# Altium footprint library Misc.PCBLIB: 128 footprints (part 4 of 8)
Each footprint in its own frame and in the unit in brackets; x right, y up, seen from the top. Pads: shape width x height; smd on the part's side, far side on the other; paste and mask are expansions set on the pad; w line width, h text height; cw(c..) or ccw(c..) is an arc to the next point about the centre after c.
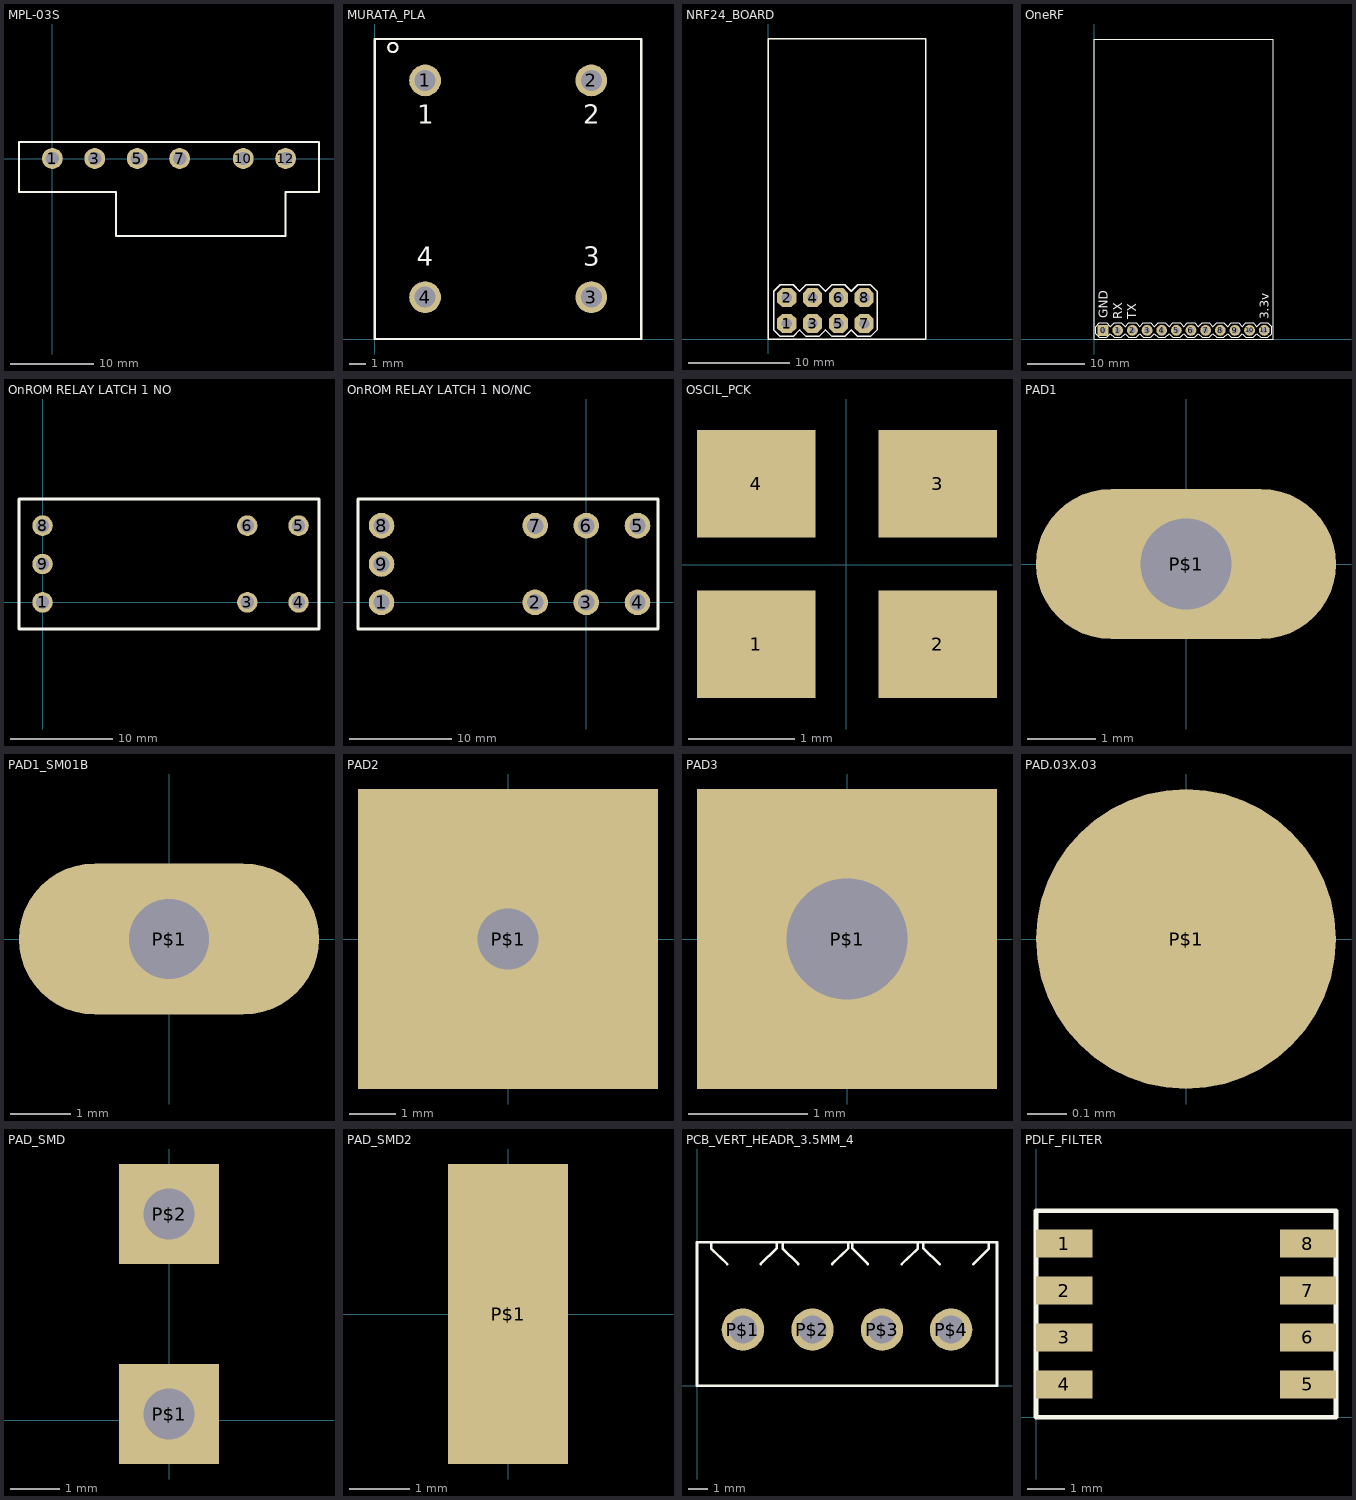
[diagram p3: the footprints below, top view; thin cyan lines are the x and y axes]

## MPL-03S [mm] "Single Output 3W Ultra-Miniature SOIP AC/DC Power Supplies"
pads (6):
  round 2.5 hole 1.6: 1(0,0) 3(5.08,0) 5(10.16,0) 7(15.24,0) 10(22.86,0) 12(27.94,0)
Top Overlay:
  lines w0.254: 31.94,1.9 31.94,-4 27.94,-4 27.94,-9.3 7.6,-9.3 7.6,-4 -4,-4 -4,2 31.94,2
3D body "MPL-03SEUP  3D.stp": height 23.72, standoff 0, extent -2.533,-7.751 30.495,1.525

## MURATA_PLA [mil]
pads (4):
  round 75 hole 50: 1(119,611) 2(512,611) 3(512,99) 4(119,99)
Top Overlay:
  circle w5: c43,689 r11
  lines w5: 0,0 630,0 630,709 0,709 0,0
  text "4" at 99,158 h77.5
  text "3" at 493,158 h77.5
  text "2" at 493,493 h77.5
  text "1" at 101,493 h77.5
3D body "User Library-PLA10-1.STEP": height 641.54, standoff -129.92, extent 19.72,19.89 610.28,680.98

## NRF24_BOARD [mil]
pads (8):
  oct 74x74 hole 40: 1(72,60) 2(72,160) 3(172,60) 4(172,160) 5(272,60) 6(272,160) 7(372,60) 8(372,160)
Top Overlay:
  lines w5: 0,0 611,0 611,1162 0,1162 0,0
  lines w6: 22,35 47,10 97,10 122,35 147,10 197,10 222,35 247,10 297,10 322,35 347,10 397,10 422,35 422,185 397,210 347,210 322,185 297,210 247,210 222,185 197,210 147,210 122,185 97,210 47,210 22,185 22,35
Mechanical 16:
  rectangle: 62,50 82,70
  rectangle: 62,150 82,170
  rectangle: 162,150 182,170
  rectangle: 162,50 182,70
  rectangle: 262,150 282,170
  rectangle: 262,50 282,70
  rectangle: 362,150 382,170
  rectangle: 362,50 382,70

## OneRF [mil]
pads (12):
  rect 74x74 hole 40: 0(59.06,59.06)
  round 74 hole 40: 1(159.06,59.06) 2(259.06,59.06) 3(359.06,59.06) 4(459.06,59.06) 5(559.06,59.06) 6(659.06,59.06) 7(759.06,59.06) 8(859.06,59.06) 9(959.06,59.06) 10(1059.06,59.06) 11(1159.06,59.06)
Top Overlay:
  lines w5: 0,0 0,2047.24 1220.47,2047.24 1220.47,0 0,0
  lines w8: 9.25,35.24 9.25,85.24 34.25,110.24 84.25,110.24 109.25,85.24 134.25,110.24 184.25,110.24 209.25,85.24 234.25,110.24 284.25,110.24 309.25,85.24 334.25,110.24 384.25,110.24 409.25,85.24 434.25,110.24 484.25,110.24 509.25,85.24 534.25,110.24 584.25,110.24 609.25,85.24 634.25,110.24 684.25,110.24 709.25,85.24 734.25,110.24 784.25,110.24 809.25,85.24 834.25,110.24 884.25,110.24 909.25,85.24 934.25,110.24 984.25,110.24 1009.25,85.24 1034.25,110.24 1084.25,110.24 1109.25,85.24 1134.25,110.24 1184.25,110.24 1209.25,85.24 1209.25,35.24 1184.25,10.24 1134.25,10.24 1109.25,35.24 1084.25,10.24 1034.25,10.24 1009.25,35.24 984.25,10.24 934.25,10.24 909.25,35.24 884.25,10.24 834.25,10.24 809.25,35.24 784.25,10.24 734.25,10.24 709.25,35.24 684.25,10.24 634.25,10.24 609.25,35.24 584.25,10.24 534.25,10.24 509.25,35.24 484.25,10.24 434.25,10.24 409.25,35.24 384.25,10.24 334.25,10.24 309.25,35.24 284.25,10.24 234.25,10.24 209.25,35.24 184.25,10.24 134.25,10.24 109.25,35.24 84.25,10.24 34.25,10.24 9.25,35.24
  text "3.3v" at 1190,135 h60
  text "TX" at 285,135 h60
  text "RX" at 190,135 h60
  text "GND" at 90,140 h60
Mechanical 16:
  rectangle: 649.25,50.24 669.25,70.24
  rectangle: 549.25,50.24 569.25,70.24
  rectangle: 449.25,50.24 469.25,70.24
  rectangle: 349.25,50.24 369.25,70.24
  rectangle: 249.25,50.24 269.25,70.24
  rectangle: 149.25,50.24 169.25,70.24
  rectangle: 49.25,50.24 69.25,70.24
  rectangle: 749.25,50.24 769.25,70.24
  rectangle: 849.25,50.24 869.25,70.24
  rectangle: 949.25,50.24 969.25,70.24
  rectangle: 1049.25,50.24 1069.25,70.24
  rectangle: 1149.25,50.24 1169.25,70.24

## OnROM RELAY LATCH 1 NO [mm]
pads (7):
  round 2 hole 1.3: 1(0,0) 3(20,0) 4(25,0) 5(25,7.5) 6(20,7.5) 8(0,7.5) 9(0,3.75)
Top Overlay:
  lines w0.254: -2.3,-2.6 27,-2.6 27,-0.1 27,7.6 27,10.1 -2.3,10.1 -2.3,7.6 -2.3,-0.1 -2.3,-2.6
3D body "G5RL_K1A_E.step": height 15.7, standoff -3.5, extent -2.3,-2.6 26.7,10.1

## OnROM RELAY LATCH 1 NO/NC [mm]
pads (9):
  round 2.5 hole 1.6: 1(-20,0) 2(-5,0) 3(0,0) 4(5,0) 5(5,7.5) 6(0,7.5) 7(-5,7.5) 8(-20,7.5) 9(-20,3.75)
Top Overlay:
  lines w0.254: -22.3,-2.6 -22.3,-0.1 -22.3,7.6 -22.3,10.1 7,10.1 7,7.6 7,-0.1 7,-2.6 -22.3,-2.6
3D body "g5rl-k1-e.stp": height 15.7, standoff -3.5, extent -22.3,-2.6 6.7,10.1

## OSCIL_PCK [mil]
pads (4):
  rect 44x40 smd: 1(-33.46,-29.53) 2(34,-29.53) 3(34,30) 4(-33.46,30)

## PAD1 [mil]
pads (1):
  oval 172x86 hole 52: P$1(0,0)

## PAD1_SM01B [mil]
pads (1):
  oval 195.63x98.58 hole 52: P$1(0,0)

## PAD2 [mil]
pads (1):
  rect 254x254 hole 52: P$1(0,0)

## PAD3 [mil]
pads (1):
  rect 99x99 hole 40: P$1(0,0)

## PAD.03X.03 [mil]
pads (1):
  rrect100% 30x30 smd paste-15: P$1(0,0)

## PAD_SMD [mil]
pads (2):
  rect 79x79 hole 40: P$1(0,5) P$2(0,163)

## PAD_SMD2 [mil]
pads (1):
  rect 79x197 smd: P$1(0,0)

## PCB_VERT_HEADR_3.5MM_4 [mil]
pads (4):
  round 84 hole 56: P$1(91,111) P$2(229,111) P$3(367,111) P$4(504,111)
Top Overlay:
  lines w5: 60,241 28,272 28,284 ; 126,241 158,272 158,284 ; 170,284 170,272 201,241 ; 268,241 300,272 300,284 ; 308,284 308,272 339,241 ; 406,241 438,272 438,284 ; 449,284 449,272 481,241 ; 548,241 579,272 579,284 ; 28,284 0,284 0,0 595,0 595,284 28,284

## PDLF_FILTER [mil]
pads (8):
  rect 60x30 smd: 1(30,185) 2(30,135) 3(30,85) 4(30,35) 5(290,35) 6(290,85) 7(290,135) 8(290,185)
Top Overlay:
  lines w5: 0,0 0,220 320,220 320,0 0,0